# Altium footprint library Connector.PcbLib: 59 footprints (part 2 of 4)
Each footprint in its own frame and in the unit in brackets; x right, y up, seen from the top. Pads: shape width x height; smd on the part's side, far side on the other; paste and mask are expansions set on the pad; w line width, h text height; cw(c..) or ccw(c..) is an arc to the next point about the centre after c.
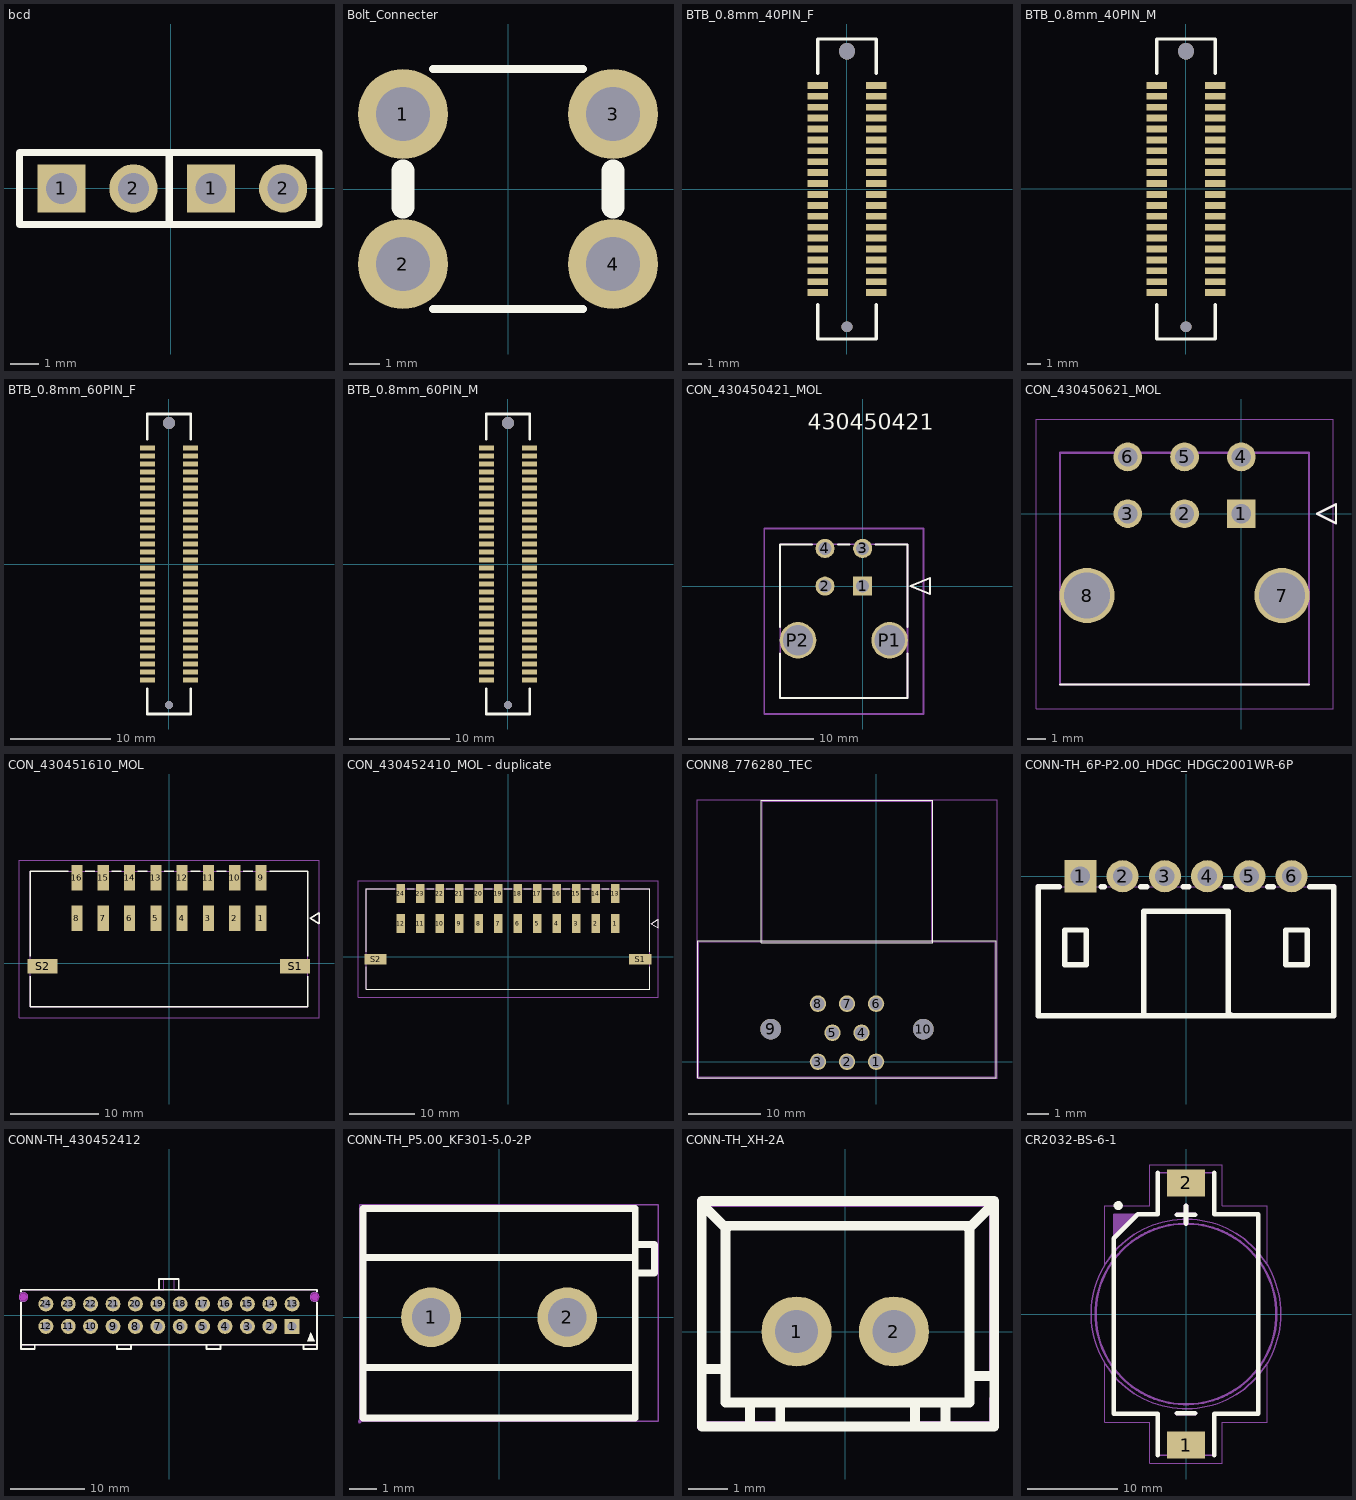
[diagram p1: the footprints below, top view; thin cyan lines are the x and y axes]

## bcd [mm]
pads (4):
  rect 1.7x1.7 hole 1.1: 1(-3.859,0) 1(1.424,0)
  round 1.7 hole 1.1: 2(-1.319,0) 2(3.964,0)
Top Overlay:
  lines w0.254: -5.339,-1.27 -0.049,-1.27 -0.049,1.27 -5.339,1.27 -5.339,-1.27 ; -0.056,-1.27 5.234,-1.27 5.234,1.27 -0.056,1.27 -0.056,-1.27
Mechanical 15:
  region: -5.239,-1.25 -5.239,-1.225 -5.274,-1.19 -5.324,-1.19 -5.359,-1.225 -5.359,-1.25 -5.359,-1.275 -5.324,-1.31 -5.274,-1.31 -5.239,-1.275 -5.239,-1.25
  region: -1.639,0.15 -0.999,0.15 -0.999,-0.15 -1.639,-0.15
  region: -4.179,0.15 -3.539,0.15 -3.539,-0.15 -4.179,-0.15
  region: 0.044,-1.25 0.044,-1.225 0.009,-1.19 -0.041,-1.19 -0.076,-1.225 -0.076,-1.25 -0.076,-1.275 -0.041,-1.31 0.009,-1.31 0.044,-1.275 0.044,-1.25
  region: 3.644,0.15 4.284,0.15 4.284,-0.15 3.644,-0.15
  region: 1.104,0.15 1.744,0.15 1.744,-0.15 1.104,-0.15
  lines w0.051: -5.299,-1.25 5.234,-1.25 5.234,1.25 -5.299,1.25 -5.299,-1.25

## Bolt_Connecter [mm]
pads (4):
  round 3 hole 1.8: 1(-3.5,2.5) 2(-3.5,-2.5) 3(3.5,2.5) 4(3.5,-2.5)
Top Overlay:
  lines w0.254: -2.5,-4 2.5,-4 ; -2.5,4 2.5,4
  lines w0.762: -3.5,-0.6 -3.5,0.6 ; 3.5,-0.6 3.5,0.6

## BTB_0.8mm_40PIN_F [mm] "0.8单槽板对板公母座合高5.0，母座，40PIN"
pads (40):
  rect 1.5x0.5 smd: 1(2.16,7.6) 2(2.16,6.8) 3(2.16,6) 4(2.16,5.2) 5(2.16,4.4) 6(2.16,3.6) 7(2.16,2.8) 8(2.16,2) 9(2.16,1.2) 10(2.16,0.4) 11(2.16,-0.4) 12(2.16,-1.2) 13(2.16,-2) 14(2.16,-2.8) 15(2.16,-3.6) 16(2.16,-4.4) 17(2.16,-5.2) 18(2.16,-6) 19(2.16,-6.8) 20(2.16,-7.6) 21(-2.16,-7.6) 22(-2.16,-6.8) 23(-2.16,-6) 24(-2.16,-5.2) 25(-2.16,-4.4) 26(-2.16,-3.6) 27(-2.16,-2.8) 28(-2.16,-2) 29(-2.16,-1.2) 30(-2.16,-0.4) 31(-2.16,0.4) 32(-2.16,1.2) 33(-2.16,2) 34(-2.16,2.8) 35(-2.16,3.6) 36(-2.16,4.4) 37(-2.16,5.2) 38(-2.16,6) 39(-2.16,6.8) 40(-2.16,7.6)
via 0,-10.1 diameter 0.8 hole 0.8
via 0,10.1 diameter 1.2 hole 1.2
Top Overlay:
  lines w0.254: -2.16,-8.5 -2.16,-11 2.16,-11 2.16,-8.5 ; -2.16,8.5 -2.16,11 2.16,11 2.16,8.5

## BTB_0.8mm_40PIN_M [mm] "0.8单槽板对板公母座合高5.0，公座，40PIN"
pads (40):
  rect 1.5x0.5 smd: 1(-2.16,7.6) 2(-2.16,6.8) 3(-2.16,6) 4(-2.16,5.2) 5(-2.16,4.4) 6(-2.16,3.6) 7(-2.16,2.8) 8(-2.16,2) 9(-2.16,1.2) 10(-2.16,0.4) 11(-2.16,-0.4) 12(-2.16,-1.2) 13(-2.16,-2) 14(-2.16,-2.8) 15(-2.16,-3.6) 16(-2.16,-4.4) 17(-2.16,-5.2) 18(-2.16,-6) 19(-2.16,-6.8) 20(-2.16,-7.6) 21(2.16,-7.6) 22(2.16,-6.8) 23(2.16,-6) 24(2.16,-5.2) 25(2.16,-4.4) 26(2.16,-3.6) 27(2.16,-2.8) 28(2.16,-2) 29(2.16,-1.2) 30(2.16,-0.4) 31(2.16,0.4) 32(2.16,1.2) 33(2.16,2) 34(2.16,2.8) 35(2.16,3.6) 36(2.16,4.4) 37(2.16,5.2) 38(2.16,6) 39(2.16,6.8) 40(2.16,7.6)
via 0,-10.1 diameter 0.8 hole 0.8
via 0,10.1 diameter 1.2 hole 1.2
Top Overlay:
  lines w0.254: -2.16,-8.5 -2.16,-11 2.16,-11 2.16,-8.5 ; -2.16,8.5 -2.16,11 2.16,11 2.16,8.5

## BTB_0.8mm_60PIN_F [mm] "0.8单槽板对板公母座合高5.0，母座，60PIN"
pads (60):
  rect 1.5x0.5 smd: 1(-2.16,11.6) 2(-2.16,10.8) 3(-2.16,10) 4(-2.16,9.2) 5(-2.16,8.4) 6(-2.16,7.6) 7(-2.16,6.8) 8(-2.16,6) 9(-2.16,5.2) 10(-2.16,4.4) 11(-2.16,3.6) 12(-2.16,2.8) 13(-2.16,2) 14(-2.16,1.2) 15(-2.16,0.4) 16(-2.16,-0.4) 17(-2.16,-1.2) 18(-2.16,-2) 19(-2.16,-2.8) 20(-2.16,-3.6) 21(-2.16,-4.4) 22(-2.16,-5.2) 23(-2.16,-6) 24(-2.16,-6.8) 25(-2.16,-7.6) 26(-2.16,-8.4) 27(-2.16,-9.2) 28(-2.16,-10) 29(-2.16,-10.8) 30(-2.16,-11.6) 31(2.16,-11.6) 32(2.16,-10.8) 33(2.16,-10) 34(2.16,-9.2) 35(2.16,-8.4) 36(2.16,-7.6) 37(2.16,-6.8) 38(2.16,-6) 39(2.16,-5.2) 40(2.16,-4.4) 41(2.16,-3.6) 42(2.16,-2.8) 43(2.16,-2) 44(2.16,-1.2) 45(2.16,-0.4) 46(2.16,0.4) 47(2.16,1.2) 48(2.16,2) 49(2.16,2.8) 50(2.16,3.6) 51(2.16,4.4) 52(2.16,5.2) 53(2.16,6) 54(2.16,6.8) 55(2.16,7.6) 56(2.16,8.4) 57(2.16,9.2) 58(2.16,10) 59(2.16,10.8) 60(2.16,11.6)
via 0,-14.1 diameter 0.8 hole 0.8
via 0,14.1 diameter 1.2 hole 1.2
Top Overlay:
  lines w0.254: -2.16,-12.5 -2.16,-15 2.16,-15 2.16,-12.5 ; -2.16,12.5 -2.16,15 2.16,15 2.16,12.5
3D body "SGD-08-F-060P-H38-G210.stp": height 0, standoff -4.85, extent -3,-14.9 3,14.9

## BTB_0.8mm_60PIN_M [mm] "0.8单槽板对板公母座合高5.0，公座，60PIN"
pads (60):
  rect 1.5x0.5 smd: 1(-2.16,11.6) 2(-2.16,10.8) 3(-2.16,10) 4(-2.16,9.2) 5(-2.16,8.4) 6(-2.16,7.6) 7(-2.16,6.8) 8(-2.16,6) 9(-2.16,5.2) 10(-2.16,4.4) 11(-2.16,3.6) 12(-2.16,2.8) 13(-2.16,2) 14(-2.16,1.2) 15(-2.16,0.4) 16(-2.16,-0.4) 17(-2.16,-1.2) 18(-2.16,-2) 19(-2.16,-2.8) 20(-2.16,-3.6) 21(-2.16,-4.4) 22(-2.16,-5.2) 23(-2.16,-6) 24(-2.16,-6.8) 25(-2.16,-7.6) 26(-2.16,-8.4) 27(-2.16,-9.2) 28(-2.16,-10) 29(-2.16,-10.8) 30(-2.16,-11.6) 31(2.16,-11.6) 32(2.16,-10.8) 33(2.16,-10) 34(2.16,-9.2) 35(2.16,-8.4) 36(2.16,-7.6) 37(2.16,-6.8) 38(2.16,-6) 39(2.16,-5.2) 40(2.16,-4.4) 41(2.16,-3.6) 42(2.16,-2.8) 43(2.16,-2) 44(2.16,-1.2) 45(2.16,-0.4) 46(2.16,0.4) 47(2.16,1.2) 48(2.16,2) 49(2.16,2.8) 50(2.16,3.6) 51(2.16,4.4) 52(2.16,5.2) 53(2.16,6) 54(2.16,6.8) 55(2.16,7.6) 56(2.16,8.4) 57(2.16,9.2) 58(2.16,10) 59(2.16,10.8) 60(2.16,11.6)
via 0,14.1 diameter 1.2 hole 1.2
via 0,-14.1 diameter 0.8 hole 0.8
Top Overlay:
  lines w0.254: -2.16,-12.5 -2.16,-15 2.16,-15 2.16,-12.5 ; -2.16,12.5 -2.16,15 2.16,15 2.16,12.5
3D body "SGD-08-M-060P-H46-G210.stp": height 2.25, standoff -3.35, extent -3,-14.9 3,14.9

## CON_430450421_MOL [mm]
pads (6):
  rect 1.52x1.52 / inner round 1.524 / far side rect 1.52x1.52 hole 1.02 paste-2539.97 mask+0.076: 1(0,0)
  round 1.52 / inner round 1.524 / far side round 1.52 hole 1.02 paste-2539.97 mask+0.076: 2(-3,0) 3(0,3) 4(-3,3)
  round 2.91 / inner round 1.524 / far side round 2.91 hole 2.41 paste-2539.97 mask+0.076: P1(2.15,-4.32) P2(-5.15,-4.32)
Top Overlay:
  lines w0.152: -6.575,-5.378 -6.575,-8.92 3.575,-8.92 3.575,-5.378 ; -6.575,-3.262 -6.575,3.32 -4.032,3.32 ; -1.968,3.32 -1.032,3.32 ; 1.032,3.32 3.575,3.32 3.575,-3.262 ; 3.829,0 5.353,-0.635 5.353,0.635 3.829,0
  text "430450421" at -4.357,12.44 h1.27
Mechanical 13:
  lines w0.127: -6.575,-8.92 -6.575,3.32 3.575,3.32 3.575,-8.92 -6.575,-8.92 ; 3.829,0 5.353,-0.635 5.353,0.635 3.829,0
  text "430450421" at -4.357,12.44 h1.27
Mechanical 15:
  lines w0.127: -7.845,-10.19 4.845,-10.19 4.845,4.59 -7.845,4.59 -7.845,-10.19
3D body "430450421.stp": height 8.83, standoff -3.12, extent -6.593,-8.889 3.607,3.351

## CON_430450621_MOL [mm]
pads (8):
  rect 1.52x1.52 hole 1.02: 1(0,0)
  round 1.52 hole 1.02: 2(-3,0) 3(-6,0) 4(0,3) 5(-3,3) 6(-6,3)
  round 2.91 hole 2.41: 7(2.15,-4.32) 8(-8.15,-4.32)
Top Overlay:
  lines w0.127: -9.575,-9.02 3.575,-9.02 ; 4,0 5,-0.5 5,0.5 4,0
Mechanical 13:
  lines w0.127: -9.575,-9.02 3.575,-9.02 3.575,3.22 -9.575,3.22 -9.575,-9.02 ; 4,0 5,-0.5 5,0.5 4,0
Mechanical 15:
  lines w0.05: -10.845,-10.29 4.845,-10.29 4.845,4.979 -10.845,4.979 -10.845,-10.29
3D body "43045-0621.stp": height 8.63, standoff -3.32, extent -9.625,-8.955 3.575,3.285

## CON_430451610_MOL [mm]
pads (18):
  rect 1.27x2.92 smd paste+0 mask+0.076: 1(10.5,5.115) 2(7.5,5.115) 3(4.5,5.115) 4(1.5,5.115) 5(-1.5,5.115) 6(-4.5,5.115) 7(-7.5,5.115) 8(-10.5,5.115) 9(10.5,9.745) 10(7.5,9.745) 11(4.5,9.745) 12(1.5,9.745) 13(-1.5,9.745) 14(-4.5,9.745) 15(-7.5,9.745) 16(-10.5,9.745)
  rect 3.43x1.65 smd paste+0 mask+0.076: S1(14.375,-0.355) S2(-14.395,-0.355)
Top Overlay:
  lines w0.152: -15.825,-1.5 -15.825,-4.955 15.825,-4.955 15.825,-1.5 ; -15.825,0.79 -15.825,10.445 -11.455,10.445 ; -9.545,10.445 -8.455,10.445 ; -6.545,10.445 -5.455,10.445 ; -3.545,10.445 -2.455,10.445 ; -0.545,10.445 0.545,10.445 ; 2.455,10.445 3.545,10.445 ; 5.455,10.445 6.545,10.445 ; 8.455,10.445 9.545,10.445 ; 11.455,10.445 15.825,10.445 15.825,0.79 ; 16.079,5.115 17.095,4.48 17.095,5.75 16.079,5.115
Mechanical 13:
  lines w0.127: -15.825,-4.955 -15.825,10.445 15.825,10.445 15.825,-4.955 -15.825,-4.955 ; 16.079,5.115 17.095,4.48 17.095,5.75 16.079,5.115
Mechanical 15:
  lines w0.127: -17.095,-6.225 17.095,-6.225 17.095,11.715 -17.095,11.715 -17.095,-6.225
3D body "430451610.stp": height 8.83, standoff 0.06, extent -15.901,-4.802 15.749,10.598

## CON_430452410_MOL - duplicate [mm] "Micro-Fit 3.0 Right-Angle Header, 3.00mm Pitch, Dual Row, 24 Circuits, with Solder Tab, Gold, Glow-Wire Capable, Black, Tape and Reel"
pads (26):
  rect 1.27x2.92 smd paste+0 mask+0.076: 1(16.5,5.115) 2(13.5,5.115) 3(10.5,5.115) 4(7.5,5.115) 5(4.5,5.115) 6(1.5,5.115) 7(-1.5,5.115) 8(-4.5,5.115) 9(-7.5,5.115) 10(-10.5,5.115) 11(-13.5,5.115) 12(-16.5,5.115) 13(16.5,9.745) 14(13.5,9.745) 15(10.5,9.745) 16(7.5,9.745) 17(4.5,9.745) 18(1.5,9.745) 19(-1.5,9.745) 20(-4.5,9.745) 21(-7.5,9.745) 22(-10.5,9.745) 23(-13.5,9.745) 24(-16.5,9.745)
  rect 3.43x1.65 smd paste+0 mask+0.076: S1(20.375,-0.355) S2(-20.395,-0.355)
Top Overlay:
  lines w0.152: -21.825,-1.5 -21.825,-4.955 21.825,-4.955 21.825,-1.5 ; -21.825,0.79 -21.825,10.445 -17.455,10.445 ; -15.545,10.445 -14.455,10.445 ; -12.545,10.445 -11.455,10.445 ; -9.545,10.445 -8.455,10.445 ; -6.545,10.445 -5.455,10.445 ; -3.545,10.445 -2.455,10.445 ; -0.545,10.445 0.545,10.445 ; 2.455,10.445 3.545,10.445 ; 5.455,10.445 6.545,10.445 ; 8.455,10.445 9.545,10.445 ; 11.455,10.445 12.545,10.445 ; 14.455,10.445 15.545,10.445 ; 17.455,10.445 21.825,10.445 21.825,0.79 ; 22.079,5.115 23.095,4.48 23.095,5.75 22.079,5.115
Mechanical 13:
  lines w0.127: -21.825,-4.955 -21.825,10.445 21.825,10.445 21.825,-4.955 -21.825,-4.955 ; 22.079,5.115 23.095,4.48 23.095,5.75 22.079,5.115
Mechanical 15:
  lines w0.127: -23.095,-6.225 23.095,-6.225 23.095,11.715 -23.095,11.715 -23.095,-6.225
3D body "430452410.stp": height 8.83, standoff 0.06, extent -21.825,-4.98 21.825,10.42

## CONN8_776280_TEC [mil]
pads (10):
  round 89 hole 69 mask+0: 1(0,0) 2(-157.48,0) 3(-314.96,0) 4(-78.74,157.48) 5(-236.22,157.48) 6(0,314.96) 7(-157.48,314.96) 8(-314.96,314.96)
  round 112 hole 112 unplated: 9(-570.87,177.17) 10(255.91,177.17)
Top Overlay:
  lines w6: -965.48,-85.43 -965.48,656.57 650.52,656.57 650.52,-85.43 -965.48,-85.43 ; -622.98,646.57 -622.98,1416.57 308.02,1416.57 308.02,646.57 -622.98,646.57
Mechanical 13:
  lines w1: -960.48,-80.43 -960.48,651.57 645.52,651.57 645.52,-80.43 -960.48,-80.43 ; -617.98,651.57 -617.98,1411.57 303.02,1411.57 303.02,651.57 -617.98,651.57
Mechanical 15:
  lines w6: -970.48,-90.43 655.52,-90.43 655.52,1421.57 -970.48,1421.57 -970.48,-90.43
3D body: height 10, standoff 0, extent 0,0 10,10
3D body "c-776280-1-h-3d.stp": height 1143.7, standoff -120.08, extent -956.69,-74.8 649.61,1413.38

## CONN-TH_6P-P2.00_HDGC_HDGC2001WR-6P [mil]
pads (6):
  rect 60x60 hole 36 mask+1.97: 1(-196.85,0)
  round 60 hole 36 mask+1.97: 2(-118.11,0) 3(-39.37,0) 4(39.37,0) 5(118.11,0) 6(196.85,0)
Top Overlay:
  lines w10: -235.95,-19.68 -275.59,-19.68 -275.59,-259.84 275.59,-259.84 275.59,-19.68 230.62,-19.68 ; -157.75,-19.68 -151.88,-19.68 ; -84.34,-19.68 -73.14,-19.68 ; -78.72,-259.84 -78.72,-65 78.74,-65 78.74,-254.02 84.56,-259.84 ; -5.6,-19.68 5.6,-19.68 ; 73.14,-19.68 84.34,-19.68 ; 151.88,-19.68 163.08,-19.68 ; -225.63,-165 -225.63,-100 -185.63,-100 -185.63,-165 -225.63,-165 ; 185.63,-165 185.63,-100 225.63,-100 225.63,-165 185.63,-165
Mechanical 6:
  region: -271.65,-15.75 -279.53,-15.75 -279.53,-263.78 279.53,-263.78 279.53,-15.75 271.65,-15.75 271.65,-255.91 -271.65,-255.91
Mechanical 15:
  region: 206.69,9.84 187.01,9.84 187.01,-20.08 206.69,-20.08
  region: 127.95,9.84 108.27,9.84 108.27,-20.08 127.95,-20.08
  region: 49.21,9.84 29.53,9.84 29.53,-20.08 49.21,-20.08
  region: -29.53,9.84 -49.21,9.84 -49.21,-20.08 -29.53,-20.08
  region: -108.27,9.84 -127.95,9.84 -127.95,-20.08 -108.27,-20.08
  region: -187.01,9.84 -206.69,9.84 -206.69,-20.08 -187.01,-20.08
  region: 29.53,9.84 49.21,9.84 49.21,-9.84 29.53,-9.84
  region: -49.21,9.84 -29.53,9.84 -29.53,-9.84 -49.21,-9.84
  region: -127.95,9.84 -108.27,9.84 -108.27,-9.84 -127.95,-9.84
  region: -206.69,9.84 -187.01,9.84 -187.01,-9.84 -206.69,-9.84
  region: 187.01,9.84 206.69,9.84 206.69,-9.84 187.01,-9.84
  region: 108.27,9.84 127.95,9.84 127.95,-9.84 108.27,-9.84
  region: -273.23,-259.84 -273.23,-258.86 -274.61,-257.48 -276.57,-257.48 -277.95,-258.86 -277.95,-259.84 -277.95,-260.82 -276.57,-262.2 -274.61,-262.2 -273.23,-260.82
  lines w2: -275.59,-259.84 275.59,-259.84 275.59,-19.68 -275.59,-19.68 -275.59,-259.84

## CONN-TH_430452412 [mm]
pads (24):
  rect 2x2 hole 1.2: 1(16.5,-1.5)
  round 2 hole 1.2: 2(13.5,-1.5) 3(10.5,-1.5) 4(7.5,-1.5) 5(4.5,-1.5) 6(1.5,-1.5) 7(-1.5,-1.5) 8(-4.5,-1.5) 9(-7.5,-1.5) 10(-10.5,-1.5) 11(-13.5,-1.5) 12(-16.5,-1.5) 13(16.5,1.5) 14(13.5,1.5) 15(10.5,1.5) 16(7.5,1.5) 17(4.5,1.5) 18(1.5,1.5) 19(-1.5,1.5) 20(-4.5,1.5) 21(-7.5,1.5) 22(-10.5,1.5) 23(-13.5,1.5) 24(-16.5,1.5)
Top Overlay:
  region: 18.5,-3.5 19.5,-3.5 19,-2.3
  lines w0.254: -19.85,1.729 -19.85,-3.97 19.85,-3.97 19.85,1.729 ; -19.85,3.151 -19.85,3.4 19.85,3.4 19.85,3.151 ; -19.84,-3.98 -19.84,-4.51 -17.99,-4.51 -17.99,-3.98 ; -6.95,-4.03 -6.95,-4.56 -5.1,-4.56 -5.1,-4.03 ; -1.344,3.47 -1.344,4.87 1.31,4.87 1.31,3.47 ; 5.05,-4.03 5.05,-4.56 6.9,-4.56 6.9,-4.03 ; 18,-4 18,-4.53 19.85,-4.53 19.85,-4
Keep-Out Layer:
  board cut-out: -18.9,2.44 -18.9,2.559 -18.991,2.78 -19.16,2.949 -19.381,3.04 -19.619,3.04 -19.84,2.949 -20.009,2.78 -20.1,2.559 -20.1,2.44 -20.1,2.321 -20.009,2.1 -19.84,1.931 -19.619,1.84 -19.381,1.84 -19.16,1.931 -18.991,2.1 -18.9,2.321 -18.9,2.44
  board cut-out: 20.1,2.44 20.1,2.559 20.009,2.78 19.84,2.949 19.619,3.04 19.381,3.04 19.16,2.949 18.991,2.78 18.9,2.559 18.9,2.44 18.9,2.321 18.991,2.1 19.16,1.931 19.381,1.84 19.619,1.84 19.84,1.931 20.009,2.1 20.1,2.321 20.1,2.44
Mechanical 1:
  circle w0.005: c-19.5,2.44 r0.6
  circle w0.005: c19.5,2.44 r0.6
Mechanical 6:
  circle w0.45: c-19.5,2.44 r0.225
  circle w0.45: c19.5,2.44 r0.225
Mechanical 15:
  region: 19.885,-3.98 19.885,-3.955 19.85,-3.92 19.8,-3.92 19.765,-3.955 19.765,-3.98 19.765,-4.005 19.8,-4.04 19.85,-4.04 19.885,-4.005 19.885,-3.98
  region: -16.82,1.82 -16.18,1.82 -16.18,1.18 -16.82,1.18
  region: -13.82,1.82 -13.18,1.82 -13.18,1.18 -13.82,1.18
  region: -10.82,1.82 -10.18,1.82 -10.18,1.18 -10.82,1.18
  region: -7.82,1.82 -7.18,1.82 -7.18,1.18 -7.82,1.18
  region: 16.18,-1.18 16.82,-1.18 16.82,-1.82 16.18,-1.82
  region: 13.18,-1.18 13.82,-1.18 13.82,-1.82 13.18,-1.82
  region: 10.18,-1.18 10.82,-1.18 10.82,-1.82 10.18,-1.82
  region: 7.18,-1.18 7.82,-1.18 7.82,-1.82 7.18,-1.82
  region: 4.18,-1.18 4.82,-1.18 4.82,-1.82 4.18,-1.82
  region: 1.18,-1.18 1.82,-1.18 1.82,-1.82 1.18,-1.82
  region: -1.82,-1.18 -1.18,-1.18 -1.18,-1.82 -1.82,-1.82
  region: -4.82,-1.18 -4.18,-1.18 -4.18,-1.82 -4.82,-1.82
  region: -7.82,-1.18 -7.18,-1.18 -7.18,-1.82 -7.82,-1.82
  region: -10.82,-1.18 -10.18,-1.18 -10.18,-1.82 -10.82,-1.82
  region: -13.82,-1.18 -13.18,-1.18 -13.18,-1.82 -13.82,-1.82
  region: -16.82,-1.18 -16.18,-1.18 -16.18,-1.82 -16.82,-1.82
  region: 16.18,1.82 16.82,1.82 16.82,1.18 16.18,1.18
  region: 13.18,1.82 13.82,1.82 13.82,1.18 13.18,1.18
  region: 10.18,1.82 10.82,1.82 10.82,1.18 10.18,1.18
  region: 7.18,1.82 7.82,1.82 7.82,1.18 7.18,1.18
  region: 4.18,1.82 4.82,1.82 4.82,1.18 4.18,1.18
  region: 1.18,1.82 1.82,1.82 1.82,1.18 1.18,1.18
  region: -1.82,1.82 -1.18,1.82 -1.18,1.18 -1.82,1.18
  region: -4.82,1.82 -4.18,1.82 -4.18,1.18 -4.82,1.18
  lines w0.051: -19.825,-3.98 19.825,-3.98 19.825,3.38 0.675,3.38 0.675,4.78 -0.675,4.78 -0.675,3.38 -19.825,3.38 -19.825,-3.98
Multi-Layer keep-out:
  region: -18.9,2.44 -18.9,2.559 -18.991,2.78 -19.16,2.949 -19.381,3.04 -19.619,3.04 -19.84,2.949 -20.009,2.78 -20.1,2.559 -20.1,2.44 -20.1,2.321 -20.009,2.1 -19.84,1.931 -19.619,1.84 -19.381,1.84 -19.16,1.931 -18.991,2.1 -18.9,2.321 -18.9,2.44
  region: 20.1,2.44 20.1,2.559 20.009,2.78 19.84,2.949 19.619,3.04 19.381,3.04 19.16,2.949 18.991,2.78 18.9,2.559 18.9,2.44 18.9,2.321 18.991,2.1 19.16,1.931 19.381,1.84 19.619,1.84 19.84,1.931 20.009,2.1 20.1,2.321 20.1,2.44

## CONN-TH_P5.00_KF301-5.0-2P [mm]
pads (2):
  round 2.2 hole 1.4: 1(-2.5,0) 2(2.5,0)
Top Overlay:
  lines w0.254: -5,-1.845 5,-1.845 ; -5,2.201 5,2.201 ; 5.08,1.626 5.708,1.626 5.708,2.667 5.08,2.667 ; -5,-3.7 5,-3.7 5,4 -5,4 -5,-3.7
Mechanical 15:
  region: -5.067,-3.827 -5.067,-3.802 -5.102,-3.767 -5.152,-3.767 -5.187,-3.802 -5.187,-3.827 -5.187,-3.852 -5.152,-3.887 -5.102,-3.887 -5.067,-3.852 -5.067,-3.827
  region: 3.1,0 3.098,0.118 3.006,0.336 2.837,0.502 2.618,0.592 2.382,0.592 2.163,0.502 1.994,0.336 1.902,0.118 1.9,0 1.902,-0.118 1.994,-0.336 2.163,-0.502 2.382,-0.592 2.618,-0.592 2.837,-0.502 3.006,-0.336 3.098,-0.118 3.1,0
  region: -1.9,0 -1.902,0.118 -1.994,0.336 -2.163,0.502 -2.382,0.592 -2.618,0.592 -2.837,0.502 -3.006,0.336 -3.098,0.118 -3.1,0 -3.098,-0.118 -3.006,-0.336 -2.837,-0.502 -2.618,-0.592 -2.382,-0.592 -2.163,-0.502 -1.994,-0.336 -1.902,-0.118 -1.9,0
  lines w0.051: -5.127,-3.827 -5.127,4.127 5.835,4.127 5.835,-3.827 -5.127,-3.827

## CONN-TH_XH-2A [mm]
pads (2):
  round 1.8 hole 1.1: 1(-1.251,0) 2(1.251,0)
Top Overlay:
  lines w0.254: -3.689,-2.447 -3.689,3.353 3.811,3.353 ; -3.689,-0.965 -3.105,-0.965 ; -3.671,-2.438 3.829,-2.438 3.829,3.353 ; -3.664,3.327 -3.664,3.251 -3.054,2.642 ; -3.08,2.718 3.194,2.718 3.194,-1.829 -3.08,-1.829 -3.08,2.692 -3.054,2.692 ; -2.445,-2.413 -2.445,-1.829 ; -1.67,-2.426 -1.67,-1.841 ; 1.797,-2.413 1.797,-1.829 ; 2.572,-2.426 2.572,-1.841 ; 3.169,2.642 3.778,3.251 3.778,3.327 ; 3.219,-1.143 3.804,-1.143
Mechanical 6:
  region: 3.9,-1.2 3.8,-1.2 3.7,-1.2 3.7,3.2 -3.5,3.2 -3.6,3.2 -3.6,-1.2 -3.8,-1.2 -3.8,3.4 3.9,3.4
  region: -3.8,-1.7 -3.8,-2.5 -1.6,-2.5 -1.6,-2.3 -3.6,-2.3 -3.6,-1.7
  region: 3.9,-1.7 3.9,-2.5 1.7,-2.5 1.7,-2.3 3.7,-2.3 3.7,-1.7
Mechanical 15:
  region: -3.69,-2.4 -3.69,-2.375 -3.725,-2.34 -3.775,-2.34 -3.81,-2.375 -3.81,-2.4 -3.81,-2.425 -3.775,-2.46 -3.725,-2.46 -3.69,-2.425 -3.69,-2.4
  region: 0.931,0.32 1.571,0.32 1.571,-0.32 0.931,-0.32
  region: -1.571,0.32 -0.931,0.32 -0.931,-0.32 -1.571,-0.32
  lines w0.051: -3.75,-2.4 3.75,-2.4 3.75,3.4 -3.75,3.4 -3.75,-2.4

## CR2032-BS-6-1 [mm]
pads (2):
  rect 4.2x3 smd: 1(0,-14.5) 2(0,14.5)
Top Overlay:
  circle w0.508: c-7.5,12 r0.25
  lines w0.508: -3.125,-15.65 -3.125,-11.05 -8,-11.05 -8,8.375 -5.325,11.05 -3.125,11.05 -3.125,15.65 ; -1,-11 1,-11 ; -1,11 1,11 ; 0,10 0,12 ; 3.125,-15.65 3.125,-11.05 8,-11.05 8,11.05 3.125,11.05 3.125,15.65
Mechanical 13:
  circle w0.254: c0,0 r10
  region: -8,11.05 -5.325,11.05 -8,8.375
  lines w0.152: -8,-11.05 -3.125,-11.05 -3.125,-15.65 0,-15.65 3.125,-15.65 3.125,-11.05 8,-11.05 8,11.05 3.125,11.05 3.125,15.65 0,15.65 -3.125,15.65 -3.125,11.05 -8,11.05 -8,-11.05
  lines w0.508: -1,-11 1,-11 ; -1,11 1,11 ; 0,10 0,12
Mechanical 15:
  circle w0.152: c0,0 r10.5
  lines w0.127: -9.006,-5.398 -9.006,-12 -4,-12 -4,-16.5 0,-16.5 4,-16.5 4,-12 9.006,-12 9.006,-5.398 ; -9.006,5.398 -9.006,12 -4,12 -4,16.5 0,16.5 4,16.5 4,12 9.006,12 9.006,5.398
3D body "CR-2032 v1.step": height 5, standoff 1.8, extent -10,-10 10,10
3D body "CR2032-BS-6-1.stp": height 5.64, standoff 0.14, extent -8,-15.65 8,15.65